# Altium footprint library My_lib.PcbLib: 63 footprints (part 4 of 4)
Each footprint in its own frame and in the unit in brackets; x right, y up, seen from the top. Pads: shape width x height; smd on the part's side, far side on the other; paste and mask are expansions set on the pad; w line width, h text height; cw(c..) or ccw(c..) is an arc to the next point about the centre after c.
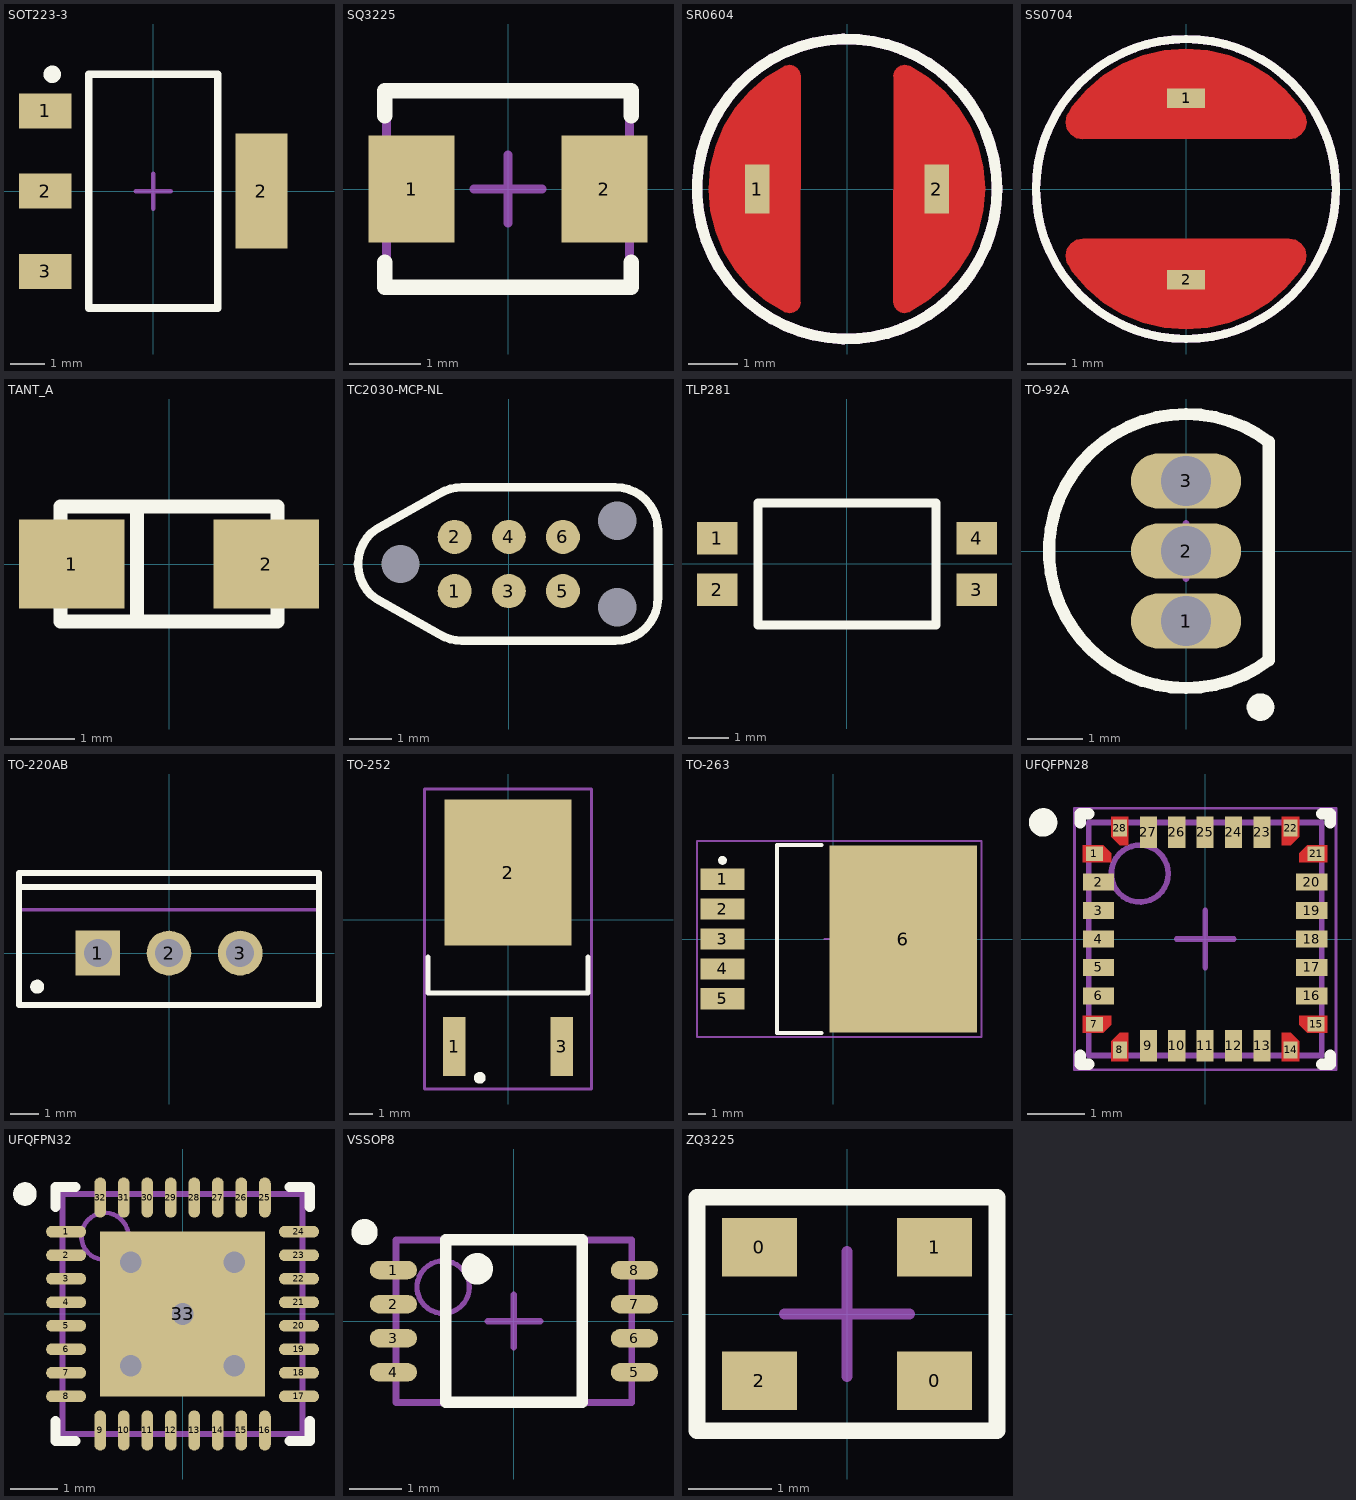
[diagram p3: the footprints below, top view; thin cyan lines are the x and y axes]

## SOT223-3 [mm] "SOT223, 4-Leads, Body 6.5x3.5mm, Pitch 2.3mm, Lead Span 7mm, IPC Medium Density"
height 1.7
pads (4):
  rect 1.5x1 smd: 1(-3.1,2.3) 2(-3.1,0) 3(-3.1,-2.3)
  rect 1.5x3.3 smd: 2(3.1,0)
Top Overlay:
  circle w0.25: c-2.9,3.35 r0.125
  lines w0.22: -1.85,-3.35 -1.85,3.35 1.85,3.35 1.85,-3.35 -1.85,-3.35
Top_Assy:
  lines w0.127: -0.5,0 0.5,0 ; 0,-0.5 0,0.5 ; -1.85,-3.35 -1.85,3.35 1.85,3.35 1.85,-3.35 -1.85,-3.35
3D body: height 1.7, standoff 0, extent -3.5,-3.25 3.5,3.25

## SQ3225 [mm] "Chip Inductor, Body o7.5mm"
height 4
pads (2):
  rect 1.2x1.5 smd: 1(-1.35,0) 2(1.35,0)
Top Overlay:
  lines w0.22: -1.725,-1.375 -1.725,-1.025 ; -1.725,1.025 -1.725,1.375 1.7,1.375 ; -1.7,-1.375 1.725,-1.375 1.725,-1.025 ; 1.725,1.025 1.725,1.375
Top_Assy:
  lines w0.127: -0.475,0 0.475,0 ; 0,-0.475 0,0.475 ; -1.7,-1.35 -1.7,1.35 1.7,1.35 1.7,-1.35 -1.7,-1.35
3D body: height 2, standoff 0, extent -1.6,-1.25 1.6,1.25

## SR0604 [mm] "Chip Inductor, Body o5.6mm"
height 4.5
pads (2):
  rect 0.5x1 smd: 1(-1.825,0) 2(1.825,0)
Top Layer:
  region: -0.949,-2.307 -0.945,2.302 -0.962,2.386 -1.01,2.458 -1.082,2.506 -1.167,2.523 -1.251,2.506 -1.265,2.497 -1.268,2.502 -1.279,2.498 -1.654,2.268 -1.989,1.982 -2.274,1.647 -2.504,1.272 -2.673,0.865 -2.776,0.437 -2.81,-0.002 -2.776,-0.44 -2.673,-0.868 -2.504,-1.275 -2.274,-1.65 -1.989,-1.985 -1.654,-2.271 -1.279,-2.501 -1.265,-2.506 -1.263,-2.501 -1.249,-2.51 -1.165,-2.527 -1.081,-2.51 -1.01,-2.463 -0.962,-2.391 -0.945,-2.307
  region: 0.948,2.297 0.944,-2.301 0.961,-2.386 1.009,-2.457 1.081,-2.505 1.165,-2.522 1.25,-2.505 1.264,-2.496 1.267,-2.502 1.277,-2.497 1.653,-2.267 1.988,-1.981 2.273,-1.647 2.503,-1.271 2.672,-0.865 2.775,-0.437 2.809,0.002 2.775,0.441 2.672,0.869 2.503,1.276 2.273,1.651 1.988,1.986 1.653,2.272 1.277,2.502 1.275,2.503 1.272,2.497 1.257,2.506 1.17,2.524 1.084,2.506 1.01,2.457 0.961,2.384 0.944,2.297
Top Overlay:
  circle w0.22: c0,0 r3.05
Top_Assy:
  circle w0.22: c0,0 r3.05
3D body: height 4.5, standoff 0, extent -2.764,-2.8 2.764,2.8

## SS0704 [mm] "Chip Inductor, Body o7.5mm"
height 4
pads (2):
  rect 1x0.5 smd: 1(0,2.362) 2(0,-2.362)
Top Layer:
  region: -3.054,1.983 -2.954,2.146 -2.582,2.582 -2.146,2.954 -1.658,3.253 -1.128,3.473 -0.571,3.606 0,3.651 0.571,3.606 1.128,3.473 1.658,3.253 2.146,2.954 2.582,2.582 2.954,2.146 3.054,1.983 3.053,1.982 3.099,1.914 3.133,1.742 3.099,1.569 3.001,1.423 2.855,1.326 2.683,1.291 2.683,1.3 -2.683,1.291 -2.855,1.326 -3.001,1.423 -3.099,1.569 -3.133,1.742 -3.099,1.914 -3.053,1.982
  region: -3.054,-1.983 -2.954,-2.146 -2.582,-2.582 -2.146,-2.954 -1.658,-3.253 -1.128,-3.473 -0.571,-3.606 0,-3.651 0.571,-3.606 1.128,-3.473 1.658,-3.253 2.146,-2.954 2.582,-2.582 2.954,-2.146 3.054,-1.983 3.053,-1.982 3.099,-1.914 3.133,-1.742 3.099,-1.569 3.001,-1.423 2.855,-1.326 2.683,-1.291 2.683,-1.3 -2.683,-1.291 -2.855,-1.326 -3.001,-1.423 -3.099,-1.569 -3.133,-1.742 -3.099,-1.914 -3.053,-1.982
Top Overlay:
  circle w0.22: c0,0 r3.9
Top_Assy:
  circle w0.22: c0,0 r3.9
3D body: height 4, standoff 0, extent -3.75,-3.75 3.75,3.75

## TANT_A [mm] "TANT_A; 2 Leads"
height 1.6
pads (2):
  rect 1.65x1.4 smd: 1(-1.525,0) 2(1.525,0)
Top Overlay:
  lines w0.22: -1.7,-0.7 -1.7,-0.9 1.7,-0.9 1.7,-0.7 ; -1.7,0.7 -1.7,0.9 1.7,0.9 1.7,0.7 ; -0.5,-0.8 -0.5,0.8
Top_Assy:
  lines w0.127: -1.7,-0.7 -1.7,-0.9 1.7,-0.9 1.7,-0.7 ; -1.7,0.7 -1.7,0.9 1.7,0.9 1.7,0.7 ; -0.5,-0.8 -0.5,0.8
3D body: height 1.6, standoff 0, extent -1.6,-0.8 1.6,0.8

## TC2030-MCP-NL [mm] "Conector ICD en placa"
height 8
pads (9):
  round 0.8 smd paste-0.4: 1(-1.27,-0.635) 2(-1.27,0.635) 3(0,-0.635) 4(0,0.635) 5(1.27,-0.635) 6(1.27,0.635)
  round 0.85 hole 0.9 unplated mask+0: ""(-2.54,0) ""(2.54,-1.016) ""(2.54,1.016)
Top Overlay:
  lines w0.2: -3.111,-0.816 cw(c-2.544,0) -3.111,0.816 -1.63,1.648 cw(c-1.1,0.8) -1.1,1.8 2.5,1.8 cw(c2.5,0.8) 3.5,0.8 3.5,-0.8 cw(c2.5,-0.8) 2.5,-1.8 -1.1,-1.8 cw(c-1.1,-0.8) -1.63,-1.648 -3.111,-0.816
3D body: height 0, standoff 0, extent -3.547,-1.809 3.509,1.809

## TLP281 [mm] "Optic"
height 2
pads (4):
  rect 1x0.8 smd: 1(-3.2,0.635) 2(-3.2,-0.635) 3(3.2,-0.635) 4(3.2,0.635)
Top Overlay:
  lines w0.22: -2.2,-1.5 -2.2,1.5 2.2,1.5 2.2,-1.5 -2.2,-1.5
Top_Assy:
  lines w0.127: -2.2,1.5 2.2,1.5 2.2,-1.5 -2.2,-1.5 -2.2,1.5 ; -2.2,1.5 -2.2,1.5
3D body: height 1.89, standoff -0.01, extent -3.5,-1.3 3.5,1.3

## TO-92A [mm] "TO, Flat Index; 3 In-Line, Axial Leads; Body Dia. 4.5mm; Leads 0.51 x 0.48 mm (max)"
height 6.86
pads (3):
  oval 2x1 hole 0.9: 1(0,-1.27) 2(0,0) 3(0,1.27)
Top Overlay:
  circle w0.25: c1.35,-2.83 r0.125
  lines w0.22: 1.5,-1.98 cw(c0,0) 1.5,1.98 1.5,-1.98
Top_Assy:
  lines w0.1: 1.5,-1.98 cw(c0,0) 1.5,1.98
  lines w0.127: -0.5,0 0.5,0 ; 0,-0.5 0,0.5 ; 1.5,-1.98 1.5,1.98
3D body: height 6.86, standoff 2.2, extent -2.497,-2.497 1.501,2.497

## TO-220AB [mm] "TO, Thru-Hole, Vertical, Heatsink Mounted; 3 In-Line Leads; Pitch 2.54 mm"
height 19.3
pads (3):
  rect 1.6x1.6 hole 1: 1(-2.54,0)
  round 1.6 hole 1: 2(0,0) 3(2.54,0)
Top Overlay:
  circle w0.25: c-4.7,-1.2 r0.125
  lines w0.22: -5.35,2.35 5.35,2.35 ; -5.35,-1.85 5.35,-1.85 5.35,2.85 -5.35,2.85 -5.35,-1.85
Top_Assy:
  lines w0.127: -5.35,1.55 5.35,1.55 ; -0.5,0 0.5,0 ; 0,-0.5 0,0.5 ; -5.35,-1.85 -5.35,2.85 5.35,2.85 5.35,-1.85 -5.35,-1.85
3D body: height 19.3, standoff 12.9, extent -5.349,1.551 5.349,2.849
3D body: height 12.9, standoff 4, extent -5.4,-1.9 5.4,2.9

## TO-252 [mm] "D-PAK, 4-Leads, Body 6.1x6.5mm, Pitch 2.28mm, Lead Span 9.7mm, IPC Medium Density"
height 2.4
pads (3):
  rect 0.95x2.5 smd: 1(-2.29,-5.4) 3(2.29,-5.4)
  rect 5.4x6.2 smd: 2(0,2)
Top Overlay:
  circle w0.25: c-1.2,-6.725 r0.125
  lines w0.22: -3.4,-1.6 -3.4,-3.125 3.4,-3.125 3.4,-1.6
Top_Assy:
  lines w0.127: -0.5,0 0.5,0 ; 0,-0.5 0,0.5 ; -3.55,-7.2 -3.55,5.55 3.55,5.55 3.55,-7.2 -3.55,-7.2
3D body: height 2.41, standoff 0, extent -3.27,-5.811 3.27,4.128

## TO-263 [mm] "D2-PAK, 6-Leads, Body 8.9x10.2mm, Pitch 1.7mm, Lead Span 15.2mm, IPC Medium Density"
height 4.83
pads (6):
  rect 2.5x1.2 smd: 1(-6.3,3.4) 2(-6.3,1.7) 3(-6.3,0) 4(-6.3,-1.7) 5(-6.3,-3.4)
  rect 8.4x10.65 smd: 6(4,0)
Top Overlay:
  circle w0.25: c-6.3,4.475 r0.125
  lines w0.22: -0.65,-5.35 -3.2,-5.35 -3.2,5.35 -0.65,5.35
Top_Assy:
  lines w0.127: -0.5,0 0.5,0 ; 0,-0.5 0,0.5 ; -7.75,-5.575 8.45,-5.575 8.45,5.575 -7.75,5.575 -7.75,-5.575
3D body: height 4.87, standoff 0, extent -7.015,-5.08 7.215,5.08

## UFQFPN28 [mm] "QFN, 28-Leads, Body 4.1x4.1mm, Pitch 0.5mm"
height 0.6
pads (28):
  rect 0.3x0.25 smd: 1(-1.95,1.5) 7(-1.95,-1.5) 15(1.95,-1.5) 21(1.95,1.5)
  rect 0.55x0.3 smd: 2(-1.875,1) 3(-1.875,0.5) 4(-1.875,0) 5(-1.875,-0.5) 6(-1.875,-1) 16(1.875,-1) 17(1.875,-0.5) 18(1.875,0) 19(1.875,0.5) 20(1.875,1)
  rect 0.25x0.3 smd: 8(-1.5,-1.95) 14(1.5,-1.95) 22(1.5,1.95) 28(-1.5,1.95)
  rect 0.3x0.55 smd: 9(-1,-1.875) 10(-0.5,-1.875) 11(0,-1.875) 12(0.5,-1.875) 13(1,-1.875) 23(1,1.875) 24(0.5,1.875) 25(0,1.875) 26(-0.5,1.875) 27(-1,1.875)
Top Layer:
  region: -2.15,-1.35 -1.65,-1.35 -1.65,-1.505 -1.795,-1.65 -2.15,-1.65
  region: -1.35,-2.15 -1.35,-1.65 -1.505,-1.65 -1.65,-1.795 -1.65,-2.15
  region: -1.35,2.15 -1.35,1.65 -1.505,1.65 -1.65,1.795 -1.65,2.15
  region: 1.35,-2.15 1.35,-1.65 1.505,-1.65 1.65,-1.795 1.65,-2.15
  region: 2.15,1.35 1.65,1.35 1.65,1.505 1.795,1.65 2.15,1.65
  region: -2.15,1.35 -1.65,1.35 -1.65,1.505 -1.795,1.65 -2.15,1.65
  region: 2.15,-1.35 1.65,-1.35 1.65,-1.505 1.795,-1.65 2.15,-1.65
  region: 1.35,2.15 1.35,1.65 1.505,1.65 1.65,1.795 1.65,2.15
Top Overlay:
  circle w0.25: c-2.85,2.05 r0.125
  lines w0.2: -2.2,-2.047 -2.2,-2.2 -2.047,-2.2 ; -2.2,2.047 -2.2,2.2 -2.047,2.2 ; 2.047,-2.2 2.2,-2.2 2.2,-2.047 ; 2.047,2.2 2.2,2.2 2.2,2.047
Top_Assy:
  circle w0.1: c-1.15,1.15 r0.5
  lines w0.1: -2.05,-2.05 2.05,-2.05 2.05,2.05 -2.05,2.05 -2.05,-2.05
Mechanical 15:
  lines w0.05: -2.3,-2.3 2.3,-2.3 2.3,2.3 -2.3,2.3 -2.3,-2.3
  lines w0.1: -0.5,0 0.5,0 ; 0,-0.5 0,0.5
3D body: height 0.6, standoff 0, extent -2.05,-2.05 2.05,2.05

## UFQFPN32 [mm] "QFN, 32-Leads, Body 5.1x5.1mm, Pitch 0.5mm, Thermal Pad 3.5x3.5mm, IPC Medium Density"
height 0.6
pads (33):
  oval 0.85x0.25 smd: 1(-2.475,1.75) 2(-2.475,1.25) 3(-2.475,0.75) 4(-2.475,0.25) 5(-2.475,-0.25) 6(-2.475,-0.75) 7(-2.475,-1.25) 8(-2.475,-1.75) 17(2.475,-1.75) 18(2.475,-1.25) 19(2.475,-0.75) 20(2.475,-0.25) 21(2.475,0.25) 22(2.475,0.75) 23(2.475,1.25) 24(2.475,1.75)
  oval 0.25x0.85 smd: 9(-1.75,-2.475) 10(-1.25,-2.475) 11(-0.75,-2.475) 12(-0.25,-2.475) 13(0.25,-2.475) 14(0.75,-2.475) 15(1.25,-2.475) 16(1.75,-2.475) 25(1.75,2.475) 26(1.25,2.475) 27(0.75,2.475) 28(0.25,2.475) 29(-0.25,2.475) 30(-0.75,2.475) 31(-1.25,2.475) 32(-1.75,2.475)
  rect 3.5x3.5 smd paste-5: 33(0,0)
via 1.1,-1.1 diameter 1.016 hole 0.457
via -1.1,-1.1 diameter 1.016 hole 0.457
via 0,0 diameter 1.016 hole 0.457
via 1.1,1.1 diameter 1.016 hole 0.457
via -1.1,1.1 diameter 1.016 hole 0.457
Top Overlay:
  circle w0.25: c-3.35,2.55 r0.125
  lines w0.22: -2.7,-2.275 -2.7,-2.7 -2.275,-2.7 ; -2.7,2.275 -2.7,2.7 -2.275,2.7 ; 2.275,-2.7 2.7,-2.7 2.7,-2.275 ; 2.275,2.7 2.7,2.7 2.7,2.275
Top Paste:
  rectangle: -1.425,1.038 1.425,1.463
  rectangle: -1.425,-1.463 1.425,-1.038
  rectangle: -1.425,-0.213 1.425,0.212
Top_Assy:
  circle w0.1: c-1.65,1.65 r0.5
  lines w0.127: -0.5,0 0.5,0 ; 0,-0.5 0,0.5 ; -2.55,-2.55 2.55,-2.55 2.55,2.55 -2.55,2.55 -2.55,-2.55
3D body: height 1.05, standoff 0, extent -2.5,-2.5 2.5,2.5

## VSSOP8 [mm] "SOP, 8-Leads, Body 4.4x3mm, Pitch 0.65mm, IPC Medium Density"
height 1.1
pads (8):
  oval 0.9x0.35 smd: 1(-2.3,0.975) 2(-2.3,0.325) 3(-2.3,-0.325) 4(-2.3,-0.975) 5(2.3,-0.975) 6(2.3,-0.325) 7(2.3,0.325) 8(2.3,0.975)
Top Overlay:
  circle w0.25: c-2.85,1.7 r0.125
  circle w0.4: c-0.7,1 r0.1
  lines w0.22: -1.3,-1.55 -1.3,1.55 1.3,1.55 1.3,-1.55 -1.3,-1.55
Top_Assy:
  circle w0.1: c-1.35,0.65 r0.5
  lines w0.127: -0.5,0 0.5,0 ; 0,-0.5 0,0.5 ; -2.25,-1.55 -2.25,1.55 2.25,1.55 2.25,-1.55 -2.25,-1.55
3D body: height 0.94, standoff -0.02, extent -2.451,-1.499 2.451,1.498

## ZQ3225 [mm]
height 0.75
pads (4):
  rect 0.9x0.7 smd: 0(-1.05,0.8) 0(1.05,-0.8) 1(1.05,0.8) 2(-1.05,-0.8)
Top Overlay:
  lines w0.2: -1.8,-1.4 -1.8,1.4 1.8,1.4 1.8,-1.4 -1.8,-1.4
Top_Assy:
  lines w0.127: -0.75,0 0,0 ; 0,-0.75 0,0 ; 0,0.75 0,0 ; 0.75,0 0,0 ; -1.8,-1.4 -1.8,1.4 1.8,1.4 1.8,-1.4 -1.8,-1.4
3D body: height 0.61, standoff 0, extent -1.6,-1.25 1.6,1.25